# Altium schematic symbol library SCHLIB.SchLib: 2608 symbols (part 15 of 20) (continued)
## R-33.2K-0402 (continued)
RES 33.2K OHM 1% 1/16W 0402; Manufacturer Part Number: RC0402FR-0733K2L; Manufacturer: YAGEO; Tolerance: 0.01; Power: 0.063W; Temperature Coefficient: ±100ppm/°C; Object  Type: Part; Design Item ID: R-33.2K-0402; Value: 33.2K; Composition: Thick Film; Features: Moisture Resistant; Operating Temperature: -55°C ~ 155°C; Height - Seated (Max): 0.40mm; Category: Resistor
footprint R0402
pins: 1, 2

## R-33.2K-0603
designator R?, comment Package: 0603  (hidden comment: 33.2K)
RES SMD 33.2K OHM 1% 1/10W 0603; Manufacturer Part Number: CRCW060333K2FKEA; Manufacturer: Vishay Dale; Tolerance: 0.01; Power: 0.1W; Temperature Coefficient: ±100ppm/°C; Object  Type: Part; Design Item ID: R-33.2K-0603; Value: 33.2K; Composition: Thick Film; Features: Automotive AEC-Q200; Operating Temperature: -55°C ~ 155°C; Height - Seated (Max): 0.50mm; Category: Resistor
footprint R0603
pins: 1, 2

## R-33.2R-0402
designator R?, comment Package: 0402  (hidden comment: 33.2R)
RES 33.2 OHM 1% 1/16W 0402; Manufacturer Part Number: RC0402FR-0733R2L; Manufacturer: YAGEO; Tolerance: 0.01; Power: 0.063W; Temperature Coefficient: ±100ppm/°C; Object  Type: Part; Design Item ID: R-33.2R-0402; Value: 33.2R; Composition: Thick Film; Features: Moisture Resistant; Operating Temperature: -55°C ~ 155°C; Height - Seated (Max): 0.40mm; Category: Resistor
footprint R0402
pins: 1, 2

## R-33.2R-0603
designator R?, comment Package: 0603  (hidden comment: 33.2R)
RES SMD 33.2 OHM 1% 1/10W 0603; Manufacturer Part Number: CRCW060333R2FKEA; Manufacturer: Vishay Dale; Tolerance: 0.01; Power: 0.1W; Temperature Coefficient: ±100ppm/°C; Object  Type: Part; Design Item ID: R-33.2R-0603; Value: 33.2R; Composition: Thick Film; Features: Automotive AEC-Q200; Operating Temperature: -55°C ~ 155°C; Height - Seated (Max): 0.50mm; Category: Resistor
footprint R0603
pins: 1, 2

## R-33K-0402
designator R?, comment Package: 0402  (hidden comment: 33K)
RES 33K OHM 1% 1/16W 0402; Manufacturer Part Number: RC0402FR-0733KL; Manufacturer: YAGEO; Tolerance: 0.01; Power: 0.063W; Temperature Coefficient: ±100ppm/°C; Object  Type: Part; Design Item ID: R-33K-0402; Value: 33K; Composition: Thick Film; Features: Moisture Resistant; Operating Temperature: -55°C ~ 155°C; Height - Seated (Max): 0.40mm; Category: Resistor
footprint R0402
pins: 1, 2

## R-33K-0603
designator R?, comment Package: 0603  (hidden comment: 33K)
RES SMD 33K OHM 1% 1/10W 0603; Manufacturer Part Number: CRCW060333K0FKEA; Manufacturer: Vishay Dale; Tolerance: 0.01; Power: 0.1W; Temperature Coefficient: ±100ppm/°C; Object  Type: Part; Design Item ID: R-33K-0603; Value: 33K; Composition: Thick Film; Features: Automotive AEC-Q200; Operating Temperature: -55°C ~ 155°C; Height - Seated (Max): 0.50mm; Category: Resistor
footprint R0603
pins: 1, 2

## R-33mR-1206
designator R?, comment Package: 1206  (hidden comment: 33mR)
RES 0.033 OHM 1% 1/4W 1206; Manufacturer Part Number: WSL1206R0330FEA; Manufacturer: Vishay Dale; Tolerance: 0.01; Power: 0.25W; Temperature Coefficient: ±75ppm/°C; Object  Type: Part; Design Item ID: R-33mR-1206; Composition: Metal Element; Features: Anti-Sulfur, Automotive AEC-Q200, Current Sense, Moisture Resistant, Pulse Withstanding; Operating Temperature: -65°C ~ 170°C; Height - Seated (Max): 0.89mm; Category: Resistor; Value: 33mR
footprint R1206
pins: 1, 2

## R-33mR-2512
designator R?, comment Package: 2512  (hidden comment: 33mR)
RES 0.033 OHM 1% 1W 2512; Manufacturer Part Number: WSL2512R0330FEA; Manufacturer: Vishay Dale; Tolerance: 0.01; Temperature Coefficient: ±75ppm/°C; Object  Type: Part; Design Item ID: R-33mR-2512; Power: 1W; Composition: Metal Element; Features: Anti-Sulfur, Automotive AEC-Q200, Current Sense, Moisture Resistant, Pulse Withstanding; Operating Temperature: -65°C ~ 170°C; Height - Seated (Max): 0.89mm; Category: Resistor; Value: 33mR
footprint R2512
pins: 1, 2

## R-33R-0402
designator R?, comment Package: 0402  (hidden comment: 33R)
RES 33 OHM 1% 1/16W 0402; Manufacturer Part Number: RC0402FR-0733RL; Manufacturer: YAGEO; Tolerance: 0.01; Power: 0.063W; Temperature Coefficient: ±100ppm/°C; Object  Type: Part; Design Item ID: R-33R-0402; Value: 33R; Composition: Thick Film; Features: Moisture Resistant; Operating Temperature: -55°C ~ 155°C; Height - Seated (Max): 0.40mm; Category: Resistor
footprint R0402
pins: 1, 2

## R-33R-0603
designator R?, comment Package: 0603  (hidden comment: 33R)
RES SMD 33 OHM 1% 1/10W 0603; Manufacturer Part Number: CRCW060333R0FKEA; Manufacturer: Vishay Dale; Tolerance: 0.01; Power: 0.1W; Temperature Coefficient: ±100ppm/°C; Object  Type: Part; Design Item ID: R-33R-0603; Value: 33R; Composition: Thick Film; Features: Automotive AEC-Q200; Operating Temperature: -55°C ~ 155°C; Height - Seated (Max): 0.50mm; Category: Resistor
footprint R0603
pins: 1, 2

## R-34.8K-0402
designator R?, comment Package: 0402  (hidden comment: 34.8K)
RES 34.8K OHM 1% 1/16W 0402; Manufacturer Part Number: RC0402FR-0734K8L; Manufacturer: YAGEO; Tolerance: 0.01; Power: 0.063W; Temperature Coefficient: ±100ppm/°C; Object  Type: Part; Design Item ID: R-34.8K-0402; Value: 34.8K; Composition: Thick Film; Features: Moisture Resistant; Operating Temperature: -55°C ~ 155°C; Height - Seated (Max): 0.40mm; Category: Resistor
footprint R0402
pins: 1, 2

## R-34.8K-0603
designator R?, comment Package: 0603  (hidden comment: 34.8K)
RES SMD 34.8K OHM 1% 1/10W 0603; Manufacturer Part Number: CRCW060334K8FKEA; Manufacturer: Vishay Dale; Tolerance: 0.01; Power: 0.1W; Temperature Coefficient: ±100ppm/°C; Object  Type: Part; Design Item ID: R-34.8K-0603; Value: 34.8K; Composition: Thick Film; Features: Automotive AEC-Q200; Operating Temperature: -55°C ~ 155°C; Height - Seated (Max): 0.50mm; Category: Resistor
footprint R0603
pins: 1, 2

## R-34.8R-0402
designator R?, comment Package: 0402  (hidden comment: 34.8R)
RES 34.8 OHM 1% 1/16W 0402; Manufacturer Part Number: RC0402FR-0734R8L; Manufacturer: YAGEO; Tolerance: 0.01; Power: 0.063W; Temperature Coefficient: ±100ppm/°C; Object  Type: Part; Design Item ID: R-34.8R-0402; Value: 34.8R; Composition: Thick Film; Features: Moisture Resistant; Operating Temperature: -55°C ~ 155°C; Height - Seated (Max): 0.40mm; Category: Resistor
footprint R0402
pins: 1, 2

## R-34.8R-0603
designator R?, comment Package: 0603  (hidden comment: 34.8R)
RES SMD 34.8 OHM 1% 1/10W 0603; Manufacturer Part Number: CRCW060334R8FKEA; Manufacturer: Vishay Dale; Tolerance: 0.01; Power: 0.1W; Temperature Coefficient: ±100ppm/°C; Object  Type: Part; Design Item ID: R-34.8R-0603; Value: 34.8R; Composition: Thick Film; Features: Automotive AEC-Q200; Operating Temperature: -55°C ~ 155°C; Height - Seated (Max): 0.50mm; Category: Resistor
footprint R0603
pins: 1, 2

## R-34K-0402
designator R?, comment Package: 0402  (hidden comment: 34K)
RES 34K OHM 1% 1/16W 0402; Manufacturer Part Number: RC0402FR-0734KL; Manufacturer: YAGEO; Tolerance: 0.01; Power: 0.063W; Temperature Coefficient: ±100ppm/°C; Object  Type: Part; Design Item ID: R-34K-0402; Value: 34K; Composition: Thick Film; Features: Moisture Resistant; Operating Temperature: -55°C ~ 155°C; Height - Seated (Max): 0.40mm; Category: Resistor
footprint R0402
pins: 1, 2

## R-34K-0603
designator R?, comment Package: 0603  (hidden comment: 34K)
RES SMD 34K OHM 1% 1/10W 0603; Manufacturer Part Number: CRCW060334K0FKEA; Manufacturer: Vishay Dale; Tolerance: 0.01; Power: 0.1W; Temperature Coefficient: ±100ppm/°C; Object  Type: Part; Design Item ID: R-34K-0603; Composition: Thick Film; Features: Automotive AEC-Q200; Operating Temperature: -55°C ~ 155°C; Height - Seated (Max): 0.50mm; Category: Resistor; Value: 34K
footprint R0603
pins: 1, 2

## R-34R-0402
designator R?, comment Package: 0402  (hidden comment: 34R)
RES 34 OHM 1% 1/16W 0402; Manufacturer Part Number: RC0402FR-0734RL; Manufacturer: YAGEO; Tolerance: 0.01; Power: 0.063W; Temperature Coefficient: ±100ppm/°C; Object  Type: Part; Design Item ID: R-34R-0402; Value: 34R; Composition: Thick Film; Features: Moisture Resistant; Operating Temperature: -55°C ~ 155°C; Height - Seated (Max): 0.40mm; Category: Resistor
footprint R0402
pins: 1, 2

## R-34R-0603
designator R?, comment Package: 0603  (hidden comment: 34R)
RES SMD 34 OHM 1% 1/10W 0603; Manufacturer Part Number: CRCW060334R0FKEA; Manufacturer: Vishay Dale; Tolerance: 0.01; Power: 0.1W; Temperature Coefficient: ±100ppm/°C; Object  Type: Part; Design Item ID: R-34R-0603; Value: 34R; Composition: Thick Film; Features: Automotive AEC-Q200; Operating Temperature: -55°C ~ 155°C; Height - Seated (Max): 0.50mm; Category: Resistor
footprint R0603
pins: 1, 2

## R-35.7K-0402
designator R?, comment Package: 0402  (hidden comment: 35.7K)
RES 35.7K OHM 1% 1/16W 0402; Manufacturer Part Number: RC0402FR-0735K7L; Manufacturer: YAGEO; Tolerance: 0.01; Power: 0.063W; Temperature Coefficient: ±100ppm/°C; Object  Type: Part; Design Item ID: R-35.7K-0402; Value: 35.7K; Composition: Thick Film; Features: Moisture Resistant; Operating Temperature: -55°C ~ 155°C; Height - Seated (Max): 0.40mm; Category: Resistor
footprint R0402
pins: 1, 2

## R-35.7K-0603
designator R?, comment Package: 0603  (hidden comment: 35.7K)
RES SMD 35.7K OHM 1% 1/10W 0603; Manufacturer Part Number: CRCW060335K7FKEA; Manufacturer: Vishay Dale; Tolerance: 0.01; Power: 0.1W; Temperature Coefficient: ±100ppm/°C; Object  Type: Part; Design Item ID: R-35.7K-0603; Value: 35.7K; Composition: Thick Film; Features: Automotive AEC-Q200; Operating Temperature: -55°C ~ 155°C; Height - Seated (Max): 0.50mm; Category: Resistor
footprint R0603
pins: 1, 2

## R-35.7R-0402
designator R?, comment Package: 0402  (hidden comment: 35.7R)
RES 35.7 OHM 1% 1/16W 0402; Manufacturer Part Number: RC0402FR-0735R7L; Manufacturer: YAGEO; Tolerance: 0.01; Power: 0.063W; Temperature Coefficient: ±100ppm/°C; Object  Type: Part; Design Item ID: R-35.7R-0402; Value: 35.7R; Composition: Thick Film; Features: Moisture Resistant; Operating Temperature: -55°C ~ 155°C; Height - Seated (Max): 0.40mm; Category: Resistor
footprint R0402
pins: 1, 2

## R-35.7R-0603
designator R?, comment Package: 0603  (hidden comment: 35.7R)
RES SMD 35.7 OHM 1% 1/10W 0603; Manufacturer Part Number: CRCW060335R7FKEA; Manufacturer: Vishay Dale; Tolerance: 0.01; Power: 0.1W; Temperature Coefficient: ±100ppm/°C; Object  Type: Part; Design Item ID: R-35.7R-0603; Value: 35.7R; Composition: Thick Film; Features: Automotive AEC-Q200; Operating Temperature: -55°C ~ 155°C; Height - Seated (Max): 0.50mm; Category: Resistor
footprint R0603
pins: 1, 2

## R-35K-0402
designator R?, comment Package: 0402  (hidden comment: 35K)
RES 35K OHM 1% 1/16W 0402; Manufacturer Part Number: RC0402FR-0735KL; Manufacturer: YAGEO; Tolerance: 0.01; Power: 0.063W; Temperature Coefficient: ±100ppm/°C; Object  Type: Part; Design Item ID: R-35K-0402; Value: 35K; Composition: Thick Film; Features: Moisture Resistant; Operating Temperature: -55°C ~ 155°C; Height - Seated (Max): 0.40mm; Category: Resistor
footprint R0402
pins: 1, 2

## R-35mR-1206
designator R?, comment Package: 1206  (hidden comment: 35mR)
RES 0.035 OHM 1% 1/4W 1206; Manufacturer Part Number: WSL1206R0350FEA; Manufacturer: Vishay Dale; Tolerance: 0.01; Power: 0.25W; Temperature Coefficient: ±75ppm/°C; Object  Type: Part; Design Item ID: R-35mR-1206; Value: 35mR; Composition: Metal Element; Features: Anti-Sulfur, Automotive AEC-Q200, Current Sense, Moisture Resistant, Pulse Withstanding; Operating Temperature: -65°C ~ 170°C; Height - Seated (Max): 0.89mm; Category: Resistor
footprint R1206
pins: 1, 2

## R-35mR-2512
designator R?, comment Package: 2512  (hidden comment: 35mR)
RES 0.035 OHM 1% 1W 2512; Manufacturer Part Number: WSL2512R0350FEA; Manufacturer: Vishay Dale; Tolerance: 0.01; Temperature Coefficient: ±75ppm/°C; Object  Type: Part; Design Item ID: R-35mR-2512; Value: 35mR; Power: 1W; Composition: Metal Element; Features: Anti-Sulfur, Automotive AEC-Q200, Current Sense, Moisture Resistant, Pulse Withstanding; Operating Temperature: -65°C ~ 170°C; Height - Seated (Max): 0.89mm; Category: Resistor
footprint R2512
pins: 1, 2

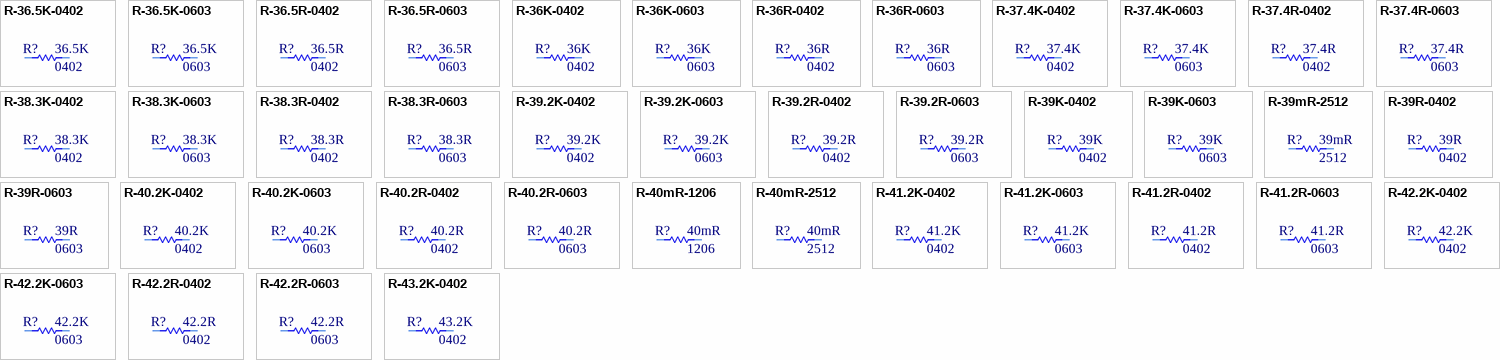
[diagram p64: symbols R-36.5K-0402 to R-43.2K-0402]

## R-36.5K-0402
designator R?, comment Package: 0402  (hidden comment: 36.5K)
RES 36.5K OHM 1% 1/16W 0402; Manufacturer Part Number: RC0402FR-0736K5L; Manufacturer: YAGEO; Tolerance: 0.01; Power: 0.063W; Temperature Coefficient: ±100ppm/°C; Object  Type: Part; Design Item ID: R-36.5K-0402; Value: 36.5K; Composition: Thick Film; Features: Moisture Resistant; Operating Temperature: -55°C ~ 155°C; Height - Seated (Max): 0.40mm; Category: Resistor
footprint R0402
pins: 1, 2

## R-36.5K-0603
designator R?, comment Package: 0603  (hidden comment: 36.5K)
RES SMD 36.5K OHM 1% 1/10W 0603; Manufacturer Part Number: CRCW060336K5FKEA; Manufacturer: Vishay Dale; Tolerance: 0.01; Power: 0.1W; Temperature Coefficient: ±100ppm/°C; Object  Type: Part; Design Item ID: R-36.5K-0603; Value: 36.5K; Composition: Thick Film; Features: Automotive AEC-Q200; Operating Temperature: -55°C ~ 155°C; Height - Seated (Max): 0.50mm; Category: Resistor
footprint R0603
pins: 1, 2

## R-36.5R-0402
designator R?, comment Package: 0402  (hidden comment: 36.5R)
RES 36.5 OHM 1% 1/16W 0402; Manufacturer Part Number: RC0402FR-0736R5L; Manufacturer: YAGEO; Tolerance: 0.01; Power: 0.063W; Temperature Coefficient: ±100ppm/°C; Object  Type: Part; Design Item ID: R-36.5R-0402; Value: 36.5R; Composition: Thick Film; Features: Moisture Resistant; Operating Temperature: -55°C ~ 155°C; Height - Seated (Max): 0.40mm; Category: Resistor
footprint R0402
pins: 1, 2

## R-36.5R-0603
designator R?, comment Package: 0603  (hidden comment: 36.5R)
RES SMD 36.5 OHM 1% 1/10W 0603; Manufacturer Part Number: CRCW060336R5FKEA; Manufacturer: Vishay Dale; Tolerance: 0.01; Power: 0.1W; Temperature Coefficient: ±100ppm/°C; Object  Type: Part; Design Item ID: R-36.5R-0603; Value: 36.5R; Composition: Thick Film; Features: Automotive AEC-Q200; Operating Temperature: -55°C ~ 155°C; Height - Seated (Max): 0.50mm; Category: Resistor
footprint R0603
pins: 1, 2

## R-36K-0402
designator R?, comment Package: 0402  (hidden comment: 36K)
RES 36K OHM 1% 1/16W 0402; Manufacturer Part Number: RC0402FR-0736KL; Manufacturer: YAGEO; Tolerance: 0.01; Power: 0.063W; Temperature Coefficient: ±100ppm/°C; Object  Type: Part; Design Item ID: R-36K-0402; Value: 36K; Composition: Thick Film; Features: Moisture Resistant; Operating Temperature: -55°C ~ 155°C; Height - Seated (Max): 0.40mm; Category: Resistor
footprint R0402
pins: 1, 2

## R-36K-0603
designator R?, comment Package: 0603  (hidden comment: 36K)
RES SMD 36K OHM 1% 1/10W 0603; Manufacturer Part Number: CRCW060336K0FKEA; Manufacturer: Vishay Dale; Tolerance: 0.01; Power: 0.1W; Temperature Coefficient: ±100ppm/°C; Object  Type: Part; Design Item ID: R-36K-0603; Value: 36K; Composition: Thick Film; Features: Automotive AEC-Q200; Operating Temperature: -55°C ~ 155°C; Height - Seated (Max): 0.50mm; Category: Resistor
footprint R0603
pins: 1, 2

## R-36R-0402
designator R?, comment Package: 0402  (hidden comment: 36R)
RES 36 OHM 1% 1/16W 0402; Manufacturer Part Number: RC0402FR-0736RL; Manufacturer: YAGEO; Tolerance: 0.01; Power: 0.063W; Temperature Coefficient: ±100ppm/°C; Object  Type: Part; Design Item ID: R-36R-0402; Value: 36R; Composition: Thick Film; Features: Moisture Resistant; Operating Temperature: -55°C ~ 155°C; Height - Seated (Max): 0.40mm; Category: Resistor
footprint R0402
pins: 1, 2

## R-36R-0603
designator R?, comment Package: 0603  (hidden comment: 36R)
RES SMD 36 OHM 1% 1/10W 0603; Manufacturer Part Number: CRCW060336R0FKEA; Manufacturer: Vishay Dale; Tolerance: 0.01; Power: 0.1W; Temperature Coefficient: ±100ppm/°C; Object  Type: Part; Design Item ID: R-36R-0603; Value: 36R; Composition: Thick Film; Features: Automotive AEC-Q200; Operating Temperature: -55°C ~ 155°C; Height - Seated (Max): 0.50mm; Category: Resistor
footprint R0603
pins: 1, 2

## R-37.4K-0402
designator R?, comment Package: 0402  (hidden comment: 37.4K)
RES 37.4K OHM 1% 1/16W 0402; Manufacturer Part Number: RC0402FR-0737K4L; Manufacturer: YAGEO; Tolerance: 0.01; Power: 0.063W; Temperature Coefficient: ±100ppm/°C; Object  Type: Part; Design Item ID: R-37.4K-0402; Value: 37.4K; Composition: Thick Film; Features: Moisture Resistant; Operating Temperature: -55°C ~ 155°C; Height - Seated (Max): 0.40mm; Category: Resistor
footprint R0402
pins: 1, 2

## R-37.4K-0603
designator R?, comment Package: 0603  (hidden comment: 37.4K)
RES SMD 37.4K OHM 1% 1/10W 0603; Manufacturer Part Number: CRCW060337K4FKEA; Manufacturer: Vishay Dale; Tolerance: 0.01; Power: 0.1W; Temperature Coefficient: ±100ppm/°C; Object  Type: Part; Design Item ID: R-37.4K-0603; Value: 37.4K; Composition: Thick Film; Features: Automotive AEC-Q200; Operating Temperature: -55°C ~ 155°C; Height - Seated (Max): 0.50mm; Category: Resistor
footprint R0603
pins: 1, 2

## R-37.4R-0402
designator R?, comment Package: 0402  (hidden comment: 37.4R)
RES 37.4 OHM 1% 1/16W 0402; Manufacturer Part Number: RC0402FR-0737R4L; Manufacturer: YAGEO; Tolerance: 0.01; Power: 0.063W; Temperature Coefficient: ±100ppm/°C; Object  Type: Part; Design Item ID: R-37.4R-0402; Value: 37.4R; Composition: Thick Film; Features: Moisture Resistant; Operating Temperature: -55°C ~ 155°C; Height - Seated (Max): 0.40mm; Category: Resistor
footprint R0402
pins: 1, 2

## R-37.4R-0603
designator R?, comment Package: 0603  (hidden comment: 37.4R)
RES SMD 37.4 OHM 1% 1/10W 0603; Manufacturer Part Number: CRCW060337R4FKEA; Manufacturer: Vishay Dale; Tolerance: 0.01; Power: 0.1W; Temperature Coefficient: ±100ppm/°C; Object  Type: Part; Design Item ID: R-37.4R-0603; Value: 37.4R; Composition: Thick Film; Features: Automotive AEC-Q200; Operating Temperature: -55°C ~ 155°C; Height - Seated (Max): 0.50mm; Category: Resistor
footprint R0603
pins: 1, 2

## R-38.3K-0402
designator R?, comment Package: 0402  (hidden comment: 38.3K)
RES 38.3K OHM 1% 1/16W 0402; Manufacturer Part Number: RC0402FR-0738K3L; Manufacturer: YAGEO; Tolerance: 0.01; Power: 0.063W; Temperature Coefficient: ±100ppm/°C; Object  Type: Part; Design Item ID: R-38.3K-0402; Value: 38.3K; Composition: Thick Film; Features: Moisture Resistant; Operating Temperature: -55°C ~ 155°C; Height - Seated (Max): 0.40mm; Category: Resistor
footprint R0402
pins: 1, 2

## R-38.3K-0603
designator R?, comment Package: 0603  (hidden comment: 38.3K)
RES SMD 38.3K OHM 1% 1/10W 0603; Manufacturer Part Number: CRCW060338K3FKEA; Manufacturer: Vishay Dale; Tolerance: 0.01; Power: 0.1W; Temperature Coefficient: ±100ppm/°C; Object  Type: Part; Design Item ID: R-38.3K-0603; Value: 38.3K; Composition: Thick Film; Features: Automotive AEC-Q200; Operating Temperature: -55°C ~ 155°C; Height - Seated (Max): 0.50mm; Category: Resistor
footprint R0603
pins: 1, 2

## R-38.3R-0402
designator R?, comment Package: 0402  (hidden comment: 38.3R)
RES 38.3 OHM 1% 1/16W 0402; Manufacturer Part Number: RC0402FR-0738R3L; Manufacturer: YAGEO; Tolerance: 0.01; Power: 0.063W; Temperature Coefficient: ±100ppm/°C; Object  Type: Part; Design Item ID: R-38.3R-0402; Value: 38.3R; Composition: Thick Film; Features: Moisture Resistant; Operating Temperature: -55°C ~ 155°C; Height - Seated (Max): 0.40mm; Category: Resistor
footprint R0402
pins: 1, 2

## R-38.3R-0603
designator R?, comment Package: 0603  (hidden comment: 38.3R)
RES SMD 38.3 OHM 1% 1/10W 0603; Manufacturer Part Number: CRCW060338R3FKEA; Manufacturer: Vishay Dale; Tolerance: 0.01; Power: 0.1W; Temperature Coefficient: ±100ppm/°C; Object  Type: Part; Design Item ID: R-38.3R-0603; Value: 38.3R; Composition: Thick Film; Features: Automotive AEC-Q200; Operating Temperature: -55°C ~ 155°C; Height - Seated (Max): 0.50mm; Category: Resistor
footprint R0603
pins: 1, 2

## R-39.2K-0402
designator R?, comment Package: 0402  (hidden comment: 39.2K)
RES 39.2K OHM 1% 1/16W 0402; Manufacturer Part Number: RC0402FR-0739K2L; Manufacturer: YAGEO; Tolerance: 0.01; Power: 0.063W; Temperature Coefficient: ±100ppm/°C; Object  Type: Part; Design Item ID: R-39.2K-0402; Value: 39.2K; Composition: Thick Film; Features: Moisture Resistant; Operating Temperature: -55°C ~ 155°C; Height - Seated (Max): 0.40mm; Category: Resistor
footprint R0402
pins: 1, 2

## R-39.2K-0603
designator R?, comment Package: 0603  (hidden comment: 39.2K)
RES SMD 39.2K OHM 1% 1/10W 0603; Manufacturer Part Number: CRCW060339K2FKEA; Manufacturer: Vishay Dale; Tolerance: 0.01; Power: 0.1W; Temperature Coefficient: ±100ppm/°C; Object  Type: Part; Design Item ID: R-39.2K-0603; Value: 39.2K; Composition: Thick Film; Features: Automotive AEC-Q200; Operating Temperature: -55°C ~ 155°C; Height - Seated (Max): 0.50mm; Category: Resistor
footprint R0603
pins: 1, 2

## R-39.2R-0402
designator R?, comment Package: 0402  (hidden comment: 39.2R)
RES 39.2 OHM 1% 1/16W 0402; Manufacturer Part Number: RC0402FR-0739R2L; Manufacturer: YAGEO; Tolerance: 0.01; Power: 0.063W; Temperature Coefficient: ±100ppm/°C; Object  Type: Part; Design Item ID: R-39.2R-0402; Value: 39.2R; Composition: Thick Film; Features: Moisture Resistant; Operating Temperature: -55°C ~ 155°C; Height - Seated (Max): 0.40mm; Category: Resistor
footprint R0402
pins: 1, 2

## R-39.2R-0603
designator R?, comment Package: 0603  (hidden comment: 39.2R)
RES SMD 39.2 OHM 1% 1/10W 0603; Manufacturer Part Number: CRCW060339R2FKEA; Manufacturer: Vishay Dale; Tolerance: 0.01; Power: 0.1W; Temperature Coefficient: ±100ppm/°C; Object  Type: Part; Design Item ID: R-39.2R-0603; Value: 39.2R; Composition: Thick Film; Features: Automotive AEC-Q200; Operating Temperature: -55°C ~ 155°C; Height - Seated (Max): 0.50mm; Category: Resistor
footprint R0603
pins: 1, 2

## R-39K-0402
designator R?, comment Package: 0402  (hidden comment: 39K)
RES 39K OHM 1% 1/16W 0402; Manufacturer Part Number: RC0402FR-0739KL; Manufacturer: YAGEO; Tolerance: 0.01; Power: 0.063W; Temperature Coefficient: ±100ppm/°C; Object  Type: Part; Design Item ID: R-39K-0402; Value: 39K; Composition: Thick Film; Features: Moisture Resistant; Operating Temperature: -55°C ~ 155°C; Height - Seated (Max): 0.40mm; Category: Resistor
footprint R0402
pins: 1, 2

## R-39K-0603
designator R?, comment Package: 0603  (hidden comment: 39K)
RES SMD 39K OHM 1% 1/10W 0603; Manufacturer Part Number: CRCW060339K0FKEA; Manufacturer: Vishay Dale; Tolerance: 0.01; Power: 0.1W; Temperature Coefficient: ±100ppm/°C; Object  Type: Part; Design Item ID: R-39K-0603; Value: 39K; Composition: Thick Film; Features: Automotive AEC-Q200; Operating Temperature: -55°C ~ 155°C; Height - Seated (Max): 0.50mm; Category: Resistor
footprint R0603
pins: 1, 2

## R-39mR-2512
designator R?, comment Package: 2512  (hidden comment: 39mR)
RES 0.039 OHM 1% 1W 2512; Manufacturer Part Number: WSL2512R0390FEA; Manufacturer: Vishay Dale; Tolerance: 0.01; Temperature Coefficient: ±75ppm/°C; Object  Type: Part; Design Item ID: R-39mR-2512; Value: 39mR; Power: 1W; Composition: Metal Element; Features: Anti-Sulfur, Automotive AEC-Q200, Current Sense, Moisture Resistant, Pulse Withstanding; Operating Temperature: -65°C ~ 170°C; Height - Seated (Max): 0.89mm; Category: Resistor
footprint R2512
pins: 1, 2

## R-39R-0402
designator R?, comment Package: 0402  (hidden comment: 39R)
RES 39 OHM 1% 1/16W 0402; Manufacturer Part Number: RC0402FR-0739RL; Manufacturer: YAGEO; Tolerance: 0.01; Power: 0.063W; Temperature Coefficient: ±100ppm/°C; Object  Type: Part; Design Item ID: R-39R-0402; Value: 39R; Composition: Thick Film; Features: Moisture Resistant; Operating Temperature: -55°C ~ 155°C; Height - Seated (Max): 0.40mm; Category: Resistor
footprint R0402
pins: 1, 2

## R-39R-0603
designator R?, comment Package: 0603  (hidden comment: 39R)
RES SMD 39 OHM 1% 1/10W 0603; Manufacturer Part Number: CRCW060339R0FKEA; Manufacturer: Vishay Dale; Tolerance: 0.01; Power: 0.1W; Temperature Coefficient: ±100ppm/°C; Object  Type: Part; Design Item ID: R-39R-0603; Value: 39R; Composition: Thick Film; Features: Automotive AEC-Q200; Operating Temperature: -55°C ~ 155°C; Height - Seated (Max): 0.50mm; Category: Resistor
footprint R0603
pins: 1, 2

## R-40.2K-0402
designator R?, comment Package: 0402  (hidden comment: 40.2K)
RES 40.2K OHM 1% 1/16W 0402; Manufacturer Part Number: RC0402FR-0740K2L; Manufacturer: YAGEO; Tolerance: 0.01; Power: 0.063W; Temperature Coefficient: ±100ppm/°C; Object  Type: Part; Design Item ID: R-40.2K-0402; Value: 40.2K; Composition: Thick Film; Features: Moisture Resistant; Operating Temperature: -55°C ~ 155°C; Height - Seated (Max): 0.40mm; Category: Resistor
footprint R0402
pins: 1, 2

## R-40.2K-0603
designator R?, comment Package: 0603  (hidden comment: 40.2K)
RES SMD 40.2K OHM 1% 1/10W 0603; Manufacturer Part Number: CRCW060340K2FKEA; Manufacturer: Vishay Dale; Tolerance: 0.01; Power: 0.1W; Temperature Coefficient: ±100ppm/°C; Object  Type: Part; Design Item ID: R-40.2K-0603; Value: 40.2K; Composition: Thick Film; Features: Automotive AEC-Q200; Operating Temperature: -55°C ~ 155°C; Height - Seated (Max): 0.50mm; Category: Resistor
footprint R0603
pins: 1, 2

## R-40.2R-0402
designator R?, comment Package: 0402  (hidden comment: 40.2R)
RES 40.2 OHM 1% 1/16W 0402; Manufacturer Part Number: RC0402FR-0740R2L; Manufacturer: YAGEO; Tolerance: 0.01; Power: 0.063W; Temperature Coefficient: ±100ppm/°C; Object  Type: Part; Design Item ID: R-40.2R-0402; Value: 40.2R; Composition: Thick Film; Features: Moisture Resistant; Operating Temperature: -55°C ~ 155°C; Height - Seated (Max): 0.40mm; Category: Resistor
footprint R0402
pins: 1, 2

## R-40.2R-0603
designator R?, comment Package: 0603  (hidden comment: 40.2R)
RES SMD 40.2 OHM 1% 1/10W 0603; Manufacturer Part Number: CRCW060340R2FKEA; Manufacturer: Vishay Dale; Tolerance: 0.01; Power: 0.1W; Temperature Coefficient: ±100ppm/°C; Object  Type: Part; Design Item ID: R-40.2R-0603; Value: 40.2R; Composition: Thick Film; Features: Automotive AEC-Q200; Operating Temperature: -55°C ~ 155°C; Height - Seated (Max): 0.50mm; Category: Resistor
footprint R0603
pins: 1, 2

## R-40mR-1206
designator R?, comment Package: 1206  (hidden comment: 40mR)
RES 0.04 OHM 1% 1/4W 1206; Manufacturer Part Number: WSL1206R0400FEA; Manufacturer: Vishay Dale; Tolerance: 0.01; Power: 0.25W; Temperature Coefficient: ±75ppm/°C; Object  Type: Part; Design Item ID: R-40mR-1206; Value: 40mR; Composition: Metal Element; Features: Anti-Sulfur, Automotive AEC-Q200, Current Sense, Moisture Resistant, Pulse Withstanding; Operating Temperature: -65°C ~ 170°C; Height - Seated (Max): 0.89mm; Category: Resistor
footprint R1206
pins: 1, 2

## R-40mR-2512
designator R?, comment Package: 2512  (hidden comment: 40mR)
RES 0.04 OHM 1% 1W 2512; Manufacturer Part Number: WSL2512R0400FEA; Manufacturer: Vishay Dale; Tolerance: 0.01; Temperature Coefficient: ±75ppm/°C; Object  Type: Part; Design Item ID: R-40mR-2512; Value: 40mR; Power: 1W; Composition: Metal Element; Features: Anti-Sulfur, Automotive AEC-Q200, Current Sense, Moisture Resistant, Pulse Withstanding; Operating Temperature: -65°C ~ 170°C; Height - Seated (Max): 0.89mm; Category: Resistor
footprint R2512
pins: 1, 2

## R-41.2K-0402
designator R?, comment Package: 0402  (hidden comment: 41.2K)
RES 41.2K OHM 1% 1/16W 0402; Manufacturer Part Number: RC0402FR-0741K2L; Manufacturer: YAGEO; Tolerance: 0.01; Power: 0.063W; Temperature Coefficient: ±100ppm/°C; Object  Type: Part; Design Item ID: R-41.2K-0402; Value: 41.2K; Composition: Thick Film; Features: Moisture Resistant; Operating Temperature: -55°C ~ 155°C; Height - Seated (Max): 0.40mm; Category: Resistor
footprint R0402
pins: 1, 2

## R-41.2K-0603
designator R?, comment Package: 0603  (hidden comment: 41.2K)
RES SMD 41.2K OHM 1% 1/10W 0603; Manufacturer Part Number: CRCW060341K2FKEA; Manufacturer: Vishay Dale; Tolerance: 0.01; Power: 0.1W; Temperature Coefficient: ±100ppm/°C; Object  Type: Part; Design Item ID: R-41.2K-0603; Value: 41.2K; Composition: Thick Film; Features: Automotive AEC-Q200; Operating Temperature: -55°C ~ 155°C; Height - Seated (Max): 0.50mm; Category: Resistor
footprint R0603
pins: 1, 2

## R-41.2R-0402
designator R?, comment Package: 0402  (hidden comment: 41.2R)
RES 41.2 OHM 1% 1/16W 0402; Manufacturer Part Number: RC0402FR-0741R2L; Manufacturer: YAGEO; Tolerance: 0.01; Power: 0.063W; Temperature Coefficient: ±100ppm/°C; Object  Type: Part; Design Item ID: R-41.2R-0402; Value: 41.2R; Composition: Thick Film; Features: Moisture Resistant; Operating Temperature: -55°C ~ 155°C; Height - Seated (Max): 0.40mm; Category: Resistor
footprint R0402
pins: 1, 2

## R-41.2R-0603
designator R?, comment Package: 0603  (hidden comment: 41.2R)
RES SMD 41.2 OHM 1% 1/10W 0603; Manufacturer Part Number: CRCW060341R2FKEA; Manufacturer: Vishay Dale; Tolerance: 0.01; Power: 0.1W; Temperature Coefficient: ±100ppm/°C; Object  Type: Part; Design Item ID: R-41.2R-0603; Value: 41.2R; Composition: Thick Film; Features: Automotive AEC-Q200; Operating Temperature: -55°C ~ 155°C; Height - Seated (Max): 0.50mm; Category: Resistor
footprint R0603
pins: 1, 2

## R-42.2K-0402
designator R?, comment Package: 0402  (hidden comment: 42.2K)
RES 42.2K OHM 1% 1/16W 0402; Manufacturer Part Number: RC0402FR-0742K2L; Manufacturer: YAGEO; Tolerance: 0.01; Power: 0.063W; Temperature Coefficient: ±100ppm/°C; Object  Type: Part; Design Item ID: R-42.2K-0402; Value: 42.2K; Composition: Thick Film; Features: Moisture Resistant; Operating Temperature: -55°C ~ 155°C; Height - Seated (Max): 0.40mm; Category: Resistor
footprint R0402
pins: 1, 2

## R-42.2K-0603
designator R?, comment Package: 0603  (hidden comment: 42.2K)
RES SMD 42.2K OHM 1% 1/10W 0603; Manufacturer Part Number: CRCW060342K2FKEA; Manufacturer: Vishay Dale; Tolerance: 0.01; Power: 0.1W; Temperature Coefficient: ±100ppm/°C; Object  Type: Part; Design Item ID: R-42.2K-0603; Value: 42.2K; Composition: Thick Film; Features: Automotive AEC-Q200; Operating Temperature: -55°C ~ 155°C; Height - Seated (Max): 0.50mm; Category: Resistor
footprint R0603
pins: 1, 2

## R-42.2R-0402
designator R?, comment Package: 0402  (hidden comment: 42.2R)
RES 42.2 OHM 1% 1/16W 0402; Manufacturer Part Number: RC0402FR-0742R2L; Manufacturer: YAGEO; Tolerance: 0.01; Power: 0.063W; Temperature Coefficient: ±100ppm/°C; Object  Type: Part; Design Item ID: R-42.2R-0402; Value: 42.2R; Composition: Thick Film; Features: Moisture Resistant; Operating Temperature: -55°C ~ 155°C; Height - Seated (Max): 0.40mm; Category: Resistor
footprint R0402
pins: 1, 2

## R-42.2R-0603
designator R?, comment Package: 0603  (hidden comment: 42.2R)
RES SMD 42.2 OHM 1% 1/10W 0603; Manufacturer Part Number: CRCW060342R2FKEA; Manufacturer: Vishay Dale; Tolerance: 0.01; Power: 0.1W; Temperature Coefficient: ±100ppm/°C; Object  Type: Part; Design Item ID: R-42.2R-0603; Value: 42.2R; Composition: Thick Film; Features: Automotive AEC-Q200; Operating Temperature: -55°C ~ 155°C; Height - Seated (Max): 0.50mm; Category: Resistor
footprint R0603
pins: 1, 2

## R-43.2K-0402
designator R?, comment Package: 0402  (hidden comment: 43.2K)
RES 43.2K OHM 1% 1/16W 0402; Manufacturer Part Number: RC0402FR-0743K2L; Manufacturer: YAGEO; Tolerance: 0.01; Power: 0.063W; Temperature Coefficient: ±100ppm/°C; Object  Type: Part; Design Item ID: R-43.2K-0402; Value: 43.2K; Composition: Thick Film; Features: Moisture Resistant; Operating Temperature: -55°C ~ 155°C; Height - Seated (Max): 0.40mm; Category: Resistor
footprint R0402
pins: 1, 2

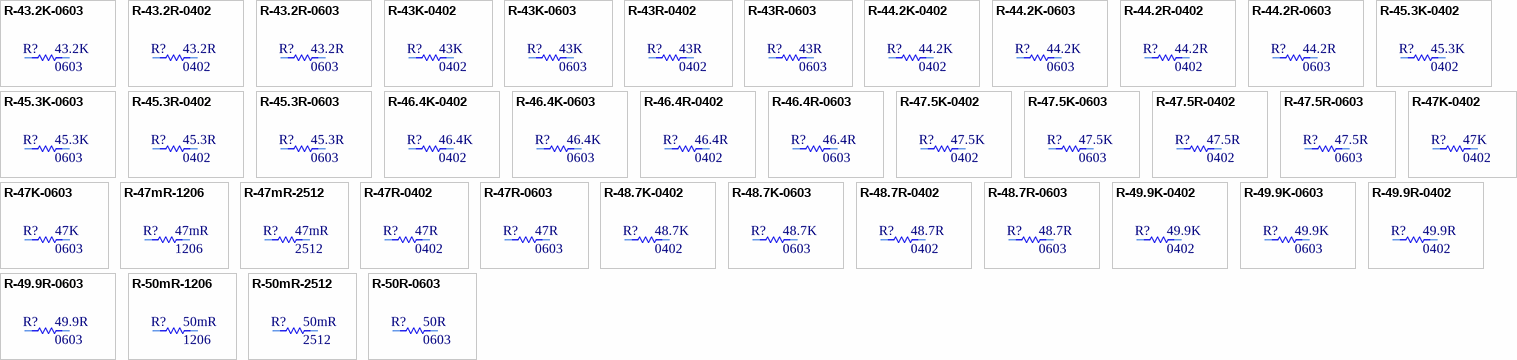
[diagram p65: symbols R-43.2K-0603 to R-50R-0603]

## R-43.2K-0603
designator R?, comment Package: 0603  (hidden comment: 43.2K)
RES SMD 43.2K OHM 1% 1/10W 0603; Manufacturer Part Number: CRCW060343K2FKEA; Manufacturer: Vishay Dale; Tolerance: 0.01; Power: 0.1W; Temperature Coefficient: ±100ppm/°C; Object  Type: Part; Design Item ID: R-43.2K-0603; Value: 43.2K; Composition: Thick Film; Features: Automotive AEC-Q200; Operating Temperature: -55°C ~ 155°C; Height - Seated (Max): 0.50mm; Category: Resistor
footprint R0603
pins: 1, 2

## R-43.2R-0402
designator R?, comment Package: 0402  (hidden comment: 43.2R)
RES 43.2 OHM 1% 1/16W 0402; Manufacturer Part Number: RC0402FR-0743R2L; Manufacturer: YAGEO; Tolerance: 0.01; Power: 0.063W; Temperature Coefficient: ±100ppm/°C; Object  Type: Part; Design Item ID: R-43.2R-0402; Value: 43.2R; Composition: Thick Film; Features: Moisture Resistant; Operating Temperature: -55°C ~ 155°C; Height - Seated (Max): 0.40mm; Category: Resistor
footprint R0402
pins: 1, 2

## R-43.2R-0603
designator R?, comment Package: 0603  (hidden comment: 43.2R)
RES SMD 43.2 OHM 1% 1/10W 0603; Manufacturer Part Number: CRCW060343R2FKEA; Manufacturer: Vishay Dale; Tolerance: 0.01; Power: 0.1W; Temperature Coefficient: ±100ppm/°C; Object  Type: Part; Design Item ID: R-43.2R-0603; Value: 43.2R; Composition: Thick Film; Features: Automotive AEC-Q200; Operating Temperature: -55°C ~ 155°C; Height - Seated (Max): 0.50mm; Category: Resistor
footprint R0603
pins: 1, 2

## R-43K-0402
designator R?, comment Package: 0402  (hidden comment: 43K)
RES 43K OHM 1% 1/16W 0402; Manufacturer Part Number: RC0402FR-0743KL; Manufacturer: YAGEO; Tolerance: 0.01; Power: 0.063W; Temperature Coefficient: ±100ppm/°C; Object  Type: Part; Design Item ID: R-43K-0402; Value: 43K; Composition: Thick Film; Features: Moisture Resistant; Operating Temperature: -55°C ~ 155°C; Height - Seated (Max): 0.40mm; Category: Resistor
footprint R0402
pins: 1, 2

## R-43K-0603
designator R?, comment Package: 0603  (hidden comment: 43K)
RES SMD 43K OHM 1% 1/10W 0603; Manufacturer Part Number: CRCW060343K0FKEA; Manufacturer: Vishay Dale; Tolerance: 0.01; Power: 0.1W; Temperature Coefficient: ±100ppm/°C; Object  Type: Part; Design Item ID: R-43K-0603; Value: 43K; Composition: Thick Film; Features: Automotive AEC-Q200; Operating Temperature: -55°C ~ 155°C; Height - Seated (Max): 0.50mm; Category: Resistor
footprint R0603
pins: 1, 2

## R-43R-0402
designator R?, comment Package: 0402  (hidden comment: 43R)
RES 43 OHM 1% 1/16W 0402; Manufacturer Part Number: RC0402FR-0743RL; Manufacturer: YAGEO; Tolerance: 0.01; Power: 0.063W; Temperature Coefficient: ±100ppm/°C; Object  Type: Part; Design Item ID: R-43R-0402; Value: 43R; Composition: Thick Film; Features: Moisture Resistant; Operating Temperature: -55°C ~ 155°C; Height - Seated (Max): 0.40mm; Category: Resistor
footprint R0402
pins: 1, 2

## R-43R-0603
designator R?, comment Package: 0603  (hidden comment: 43R)
RES SMD 43 OHM 1% 1/10W 0603; Manufacturer Part Number: CRCW060343R0FKEA; Manufacturer: Vishay Dale; Tolerance: 0.01; Power: 0.1W; Temperature Coefficient: ±100ppm/°C; Object  Type: Part; Design Item ID: R-43R-0603; Value: 43R; Composition: Thick Film; Features: Automotive AEC-Q200; Operating Temperature: -55°C ~ 155°C; Height - Seated (Max): 0.50mm; Category: Resistor
footprint R0603
pins: 1, 2

## R-44.2K-0402
designator R?, comment Package: 0402  (hidden comment: 44.2K)
RES 44.2K OHM 1% 1/16W 0402; Manufacturer Part Number: RC0402FR-0744K2L; Manufacturer: YAGEO; Tolerance: 0.01; Power: 0.063W; Temperature Coefficient: ±100ppm/°C; Object  Type: Part; Design Item ID: R-44.2K-0402; Value: 44.2K; Composition: Thick Film; Features: Moisture Resistant; Operating Temperature: -55°C ~ 155°C; Height - Seated (Max): 0.40mm; Category: Resistor
footprint R0402
pins: 1, 2

## R-44.2K-0603
designator R?, comment Package: 0603  (hidden comment: 44.2K)
RES SMD 44.2K OHM 1% 1/10W 0603; Manufacturer Part Number: CRCW060344K2FKEA; Manufacturer: Vishay Dale; Tolerance: 0.01; Power: 0.1W; Temperature Coefficient: ±100ppm/°C; Object  Type: Part; Design Item ID: R-44.2K-0603; Value: 44.2K; Composition: Thick Film; Features: Automotive AEC-Q200; Operating Temperature: -55°C ~ 155°C; Height - Seated (Max): 0.50mm; Category: Resistor
footprint R0603
pins: 1, 2

## R-44.2R-0402
designator R?, comment Package: 0402  (hidden comment: 44.2R)
RES 44.2 OHM 1% 1/16W 0402; Manufacturer Part Number: RC0402FR-0744R2L; Manufacturer: YAGEO; Tolerance: 0.01; Power: 0.063W; Temperature Coefficient: ±100ppm/°C; Object  Type: Part; Design Item ID: R-44.2R-0402; Value: 44.2R; Composition: Thick Film; Features: Moisture Resistant; Operating Temperature: -55°C ~ 155°C; Height - Seated (Max): 0.40mm; Category: Resistor
footprint R0402
pins: 1, 2

## R-44.2R-0603
designator R?, comment Package: 0603  (hidden comment: 44.2R)
RES SMD 44.2 OHM 1% 1/10W 0603; Manufacturer Part Number: CRCW060344R2FKEA; Manufacturer: Vishay Dale; Tolerance: 0.01; Power: 0.1W; Temperature Coefficient: ±100ppm/°C; Object  Type: Part; Design Item ID: R-44.2R-0603; Value: 44.2R; Composition: Thick Film; Features: Automotive AEC-Q200; Operating Temperature: -55°C ~ 155°C; Height - Seated (Max): 0.50mm; Category: Resistor
footprint R0603
pins: 1, 2

## R-45.3K-0402
designator R?, comment Package: 0402  (hidden comment: 45.3K)
RES 45.3K OHM 1% 1/16W 0402; Manufacturer Part Number: RC0402FR-0745K3L; Manufacturer: YAGEO; Tolerance: 0.01; Power: 0.063W; Temperature Coefficient: ±100ppm/°C; Object  Type: Part; Design Item ID: R-45.3K-0402; Value: 45.3K; Composition: Thick Film; Features: Moisture Resistant; Operating Temperature: -55°C ~ 155°C; Height - Seated (Max): 0.40mm; Category: Resistor
footprint R0402
pins: 1, 2

## R-45.3K-0603
designator R?, comment Package: 0603  (hidden comment: 45.3K)
RES SMD 45.3K OHM 1% 1/10W 0603; Manufacturer Part Number: CRCW060345K3FKEA; Manufacturer: Vishay Dale; Tolerance: 0.01; Power: 0.1W; Temperature Coefficient: ±100ppm/°C; Object  Type: Part; Design Item ID: R-45.3K-0603; Value: 45.3K; Composition: Thick Film; Features: Automotive AEC-Q200; Operating Temperature: -55°C ~ 155°C; Height - Seated (Max): 0.50mm; Category: Resistor
footprint R0603
pins: 1, 2

## R-45.3R-0402
designator R?, comment Package: 0402  (hidden comment: 45.3R)
RES 45.3 OHM 1% 1/16W 0402; Manufacturer Part Number: RC0402FR-0745R3L; Manufacturer: YAGEO; Tolerance: 0.01; Power: 0.063W; Temperature Coefficient: ±100ppm/°C; Object  Type: Part; Design Item ID: R-45.3R-0402; Value: 45.3R; Composition: Thick Film; Features: Moisture Resistant; Operating Temperature: -55°C ~ 155°C; Height - Seated (Max): 0.40mm; Category: Resistor
footprint R0402
pins: 1, 2

## R-45.3R-0603
designator R?, comment Package: 0603  (hidden comment: 45.3R)
RES SMD 45.3 OHM 1% 1/10W 0603; Manufacturer Part Number: CRCW060345R3FKEA; Manufacturer: Vishay Dale; Tolerance: 0.01; Power: 0.1W; Temperature Coefficient: ±100ppm/°C; Object  Type: Part; Design Item ID: R-45.3R-0603; Value: 45.3R; Composition: Thick Film; Features: Automotive AEC-Q200; Operating Temperature: -55°C ~ 155°C; Height - Seated (Max): 0.50mm; Category: Resistor
footprint R0603
pins: 1, 2

## R-46.4K-0402
designator R?, comment Package: 0402  (hidden comment: 46.4K)
RES 46.4K OHM 1% 1/16W 0402; Manufacturer Part Number: RC0402FR-0746K4L; Manufacturer: YAGEO; Tolerance: 0.01; Power: 0.063W; Temperature Coefficient: ±100ppm/°C; Object  Type: Part; Design Item ID: R-46.4K-0402; Value: 46.4K; Composition: Thick Film; Features: Moisture Resistant; Operating Temperature: -55°C ~ 155°C; Height - Seated (Max): 0.40mm; Category: Resistor
footprint R0402
pins: 1, 2

## R-46.4K-0603
designator R?, comment Package: 0603  (hidden comment: 46.4K)
RES SMD 46.4K OHM 1% 1/10W 0603; Manufacturer Part Number: CRCW060346K4FKEA; Manufacturer: Vishay Dale; Tolerance: 0.01; Power: 0.1W; Temperature Coefficient: ±100ppm/°C; Object  Type: Part; Design Item ID: R-46.4K-0603; Value: 46.4K; Composition: Thick Film; Features: Automotive AEC-Q200; Operating Temperature: -55°C ~ 155°C; Height - Seated (Max): 0.50mm; Category: Resistor
footprint R0603
pins: 1, 2

## R-46.4R-0402
designator R?, comment Package: 0402  (hidden comment: 46.4R)
RES 46.4 OHM 1% 1/16W 0402; Manufacturer Part Number: RC0402FR-0746R4L; Manufacturer: YAGEO; Tolerance: 0.01; Power: 0.063W; Temperature Coefficient: ±100ppm/°C; Object  Type: Part; Design Item ID: R-46.4R-0402; Value: 46.4R; Composition: Thick Film; Features: Moisture Resistant; Operating Temperature: -55°C ~ 155°C; Height - Seated (Max): 0.40mm; Category: Resistor
footprint R0402
pins: 1, 2

## R-46.4R-0603
designator R?, comment Package: 0603  (hidden comment: 46.4R)
RES SMD 46.4 OHM 1% 1/10W 0603; Manufacturer Part Number: CRCW060346R4FKEA; Manufacturer: Vishay Dale; Tolerance: 0.01; Power: 0.1W; Temperature Coefficient: ±100ppm/°C; Object  Type: Part; Design Item ID: R-46.4R-0603; Value: 46.4R; Composition: Thick Film; Features: Automotive AEC-Q200; Operating Temperature: -55°C ~ 155°C; Height - Seated (Max): 0.50mm; Category: Resistor
footprint R0603
pins: 1, 2

## R-47.5K-0402
designator R?, comment Package: 0402  (hidden comment: 47.5K)
RES 47.5K OHM 1% 1/16W 0402; Manufacturer Part Number: RC0402FR-0747K5L; Manufacturer: YAGEO; Tolerance: 0.01; Power: 0.063W; Temperature Coefficient: ±100ppm/°C; Object  Type: Part; Design Item ID: R-47.5K-0402; Value: 47.5K; Composition: Thick Film; Features: Moisture Resistant; Operating Temperature: -55°C ~ 155°C; Height - Seated (Max): 0.40mm; Category: Resistor
footprint R0402
pins: 1, 2

## R-47.5K-0603
designator R?, comment Package: 0603  (hidden comment: 47.5K)
RES SMD 47.5K OHM 1% 1/10W 0603; Manufacturer Part Number: CRCW060347K5FKEA; Manufacturer: Vishay Dale; Tolerance: 0.01; Power: 0.1W; Temperature Coefficient: ±100ppm/°C; Object  Type: Part; Design Item ID: R-47.5K-0603; Value: 47.5K; Composition: Thick Film; Features: Automotive AEC-Q200; Operating Temperature: -55°C ~ 155°C; Height - Seated (Max): 0.50mm; Category: Resistor
footprint R0603
pins: 1, 2

## R-47.5R-0402
designator R?, comment Package: 0402  (hidden comment: 47.5R)
RES 47.5 OHM 1% 1/16W 0402; Manufacturer Part Number: RC0402FR-0747R5L; Manufacturer: YAGEO; Tolerance: 0.01; Power: 0.063W; Temperature Coefficient: ±100ppm/°C; Object  Type: Part; Design Item ID: R-47.5R-0402; Value: 47.5R; Composition: Thick Film; Features: Moisture Resistant; Operating Temperature: -55°C ~ 155°C; Height - Seated (Max): 0.40mm; Category: Resistor
footprint R0402
pins: 1, 2

## R-47.5R-0603
designator R?, comment Package: 0603  (hidden comment: 47.5R)
RES SMD 47.5 OHM 1% 1/10W 0603; Manufacturer Part Number: CRCW060347R5FKEA; Manufacturer: Vishay Dale; Tolerance: 0.01; Power: 0.1W; Temperature Coefficient: ±100ppm/°C; Object  Type: Part; Design Item ID: R-47.5R-0603; Value: 47.5R; Composition: Thick Film; Features: Automotive AEC-Q200; Operating Temperature: -55°C ~ 155°C; Height - Seated (Max): 0.50mm; Category: Resistor
footprint R0603
pins: 1, 2

## R-47K-0402
designator R?, comment Package: 0402  (hidden comment: 47K)
RES 47K OHM 1% 1/16W 0402; Manufacturer Part Number: RC0402FR-0747KL; Manufacturer: YAGEO; Tolerance: 0.01; Power: 0.063W; Temperature Coefficient: ±100ppm/°C; Object  Type: Part; Design Item ID: R-47K-0402; Value: 47K; Composition: Thick Film; Features: Moisture Resistant; Operating Temperature: -55°C ~ 155°C; Height - Seated (Max): 0.40mm; Category: Resistor
footprint R0402
pins: 1, 2